# Altium integrated library Samtec 2 mm Pitch Terminal Strips.IntLib: 623 symbols (part 4 of 5) (continued)
## TW-05-07-T-D-500-SM (continued)
SMT Board Stacker, Vertical, -55 to 105 degC, 2 mm Pitch, 10-Pin, Male, RoHS; Manufacturer: Samtec; PartNumber: TW-05-07-T-D-500-SM; Pitch: 2 mm; DatasheetVersion: F-214; PackageVersion: CL, 3/1993; PackageReference: TW-05-07-X-D-500-SM; PackageDescription: High Temp 2mm SMT Board Stacking Terminal Strip ASM; Orientation: Vertical; RoHS: True; Temperature Range: -55 to 105 degC; Mounting Technology: Surface Mount; ComponentLink1Description: Manufacturer URL; ComponentLink1URL: http://www.samtec.com; ComponentLink2Description: Datasheet; ComponentLink2URL: http://d2a072wq521u33.cloudfront.net/catalog_english//TW_SM.PDF; ComponentLink3Description: Package Specification; ComponentLink3URL: http://www.samtec.com/documents/webfiles/cpdf/TW-XX-XX-XXX-X-XXX-SM-XXX-XX-MKT1.pdf
footprint SMTC-TW-05-07-X-D-500-SM (SMT Board Stacking Terminal Strip ASM, 2x5 Pins, Vertical, 2mm Pitch, Male)
pins: 1, 2, 3, 4, 5, 6, 7, 8, 9, 10

## TW-05-07-T-D-500-SM-A
designator P?
SMT Board Stacker, Vertical, -55 to 105 degC, 2 mm Pitch, 10-Pin, Male, RoHS; Manufacturer: Samtec; PartNumber: TW-05-07-T-D-500-SM-A; Pitch: 2 mm; DatasheetVersion: F-214; PackageVersion: CL, 3/1993; PackageReference: TW-05-07-X-D-500-SM-A; PackageDescription: High Temp 2mm SMT Board Stacking Terminal Strip ASM; Orientation: Vertical; RoHS: True; Temperature Range: -55 to 105 degC; Mounting Technology: Surface Mount; ComponentLink1Description: Manufacturer URL; ComponentLink1URL: http://www.samtec.com; ComponentLink2Description: Datasheet; ComponentLink2URL: http://d2a072wq521u33.cloudfront.net/catalog_english//TW_SM.PDF; ComponentLink3Description: Package Specification; ComponentLink3URL: http://www.samtec.com/documents/webfiles/cpdf/TW-XX-XX-XXX-X-XXX-SM-XXX-XX-MKT1.pdf
footprint SMTC-TW-05-07-X-D-500-SM-A (SMT Board Stacking Terminal Strip ASM, 2x5 Pins, Vertical, 2mm Pitch, Male)
pins: 1, 2, 3, 4, 5, 6, 7, 8, 9, 10

## TW-05-07-T-D-560-SM
designator P?
SMT Board Stacker, Vertical, -55 to 105 degC, 2 mm Pitch, 10-Pin, Male, RoHS; Manufacturer: Samtec; PartNumber: TW-05-07-T-D-560-SM; Pitch: 2 mm; DatasheetVersion: F-214; PackageVersion: CL, 3/1993; PackageReference: TW-05-07-X-D-560-SM; PackageDescription: High Temp 2mm SMT Board Stacking Terminal Strip ASM; Orientation: Vertical; RoHS: True; Temperature Range: -55 to 105 degC; Mounting Technology: Surface Mount; ComponentLink1Description: Manufacturer URL; ComponentLink1URL: http://www.samtec.com; ComponentLink2Description: Datasheet; ComponentLink2URL: http://d2a072wq521u33.cloudfront.net/catalog_english//TW_SM.PDF; ComponentLink3Description: Package Specification; ComponentLink3URL: http://www.samtec.com/documents/webfiles/cpdf/TW-XX-XX-XXX-X-XXX-SM-XXX-XX-MKT1.pdf
footprint SMTC-TW-05-07-X-D-560-SM (SMT Board Stacking Terminal Strip ASM, 2x5 Pins, Vertical, 2mm Pitch, Male)
pins: 1, 2, 3, 4, 5, 6, 7, 8, 9, 10

## TW-05-09-F-S-260-100
designator P?
Through-Hole Board Stacker, Vertical, -55 to 125 degC, 2 mm Pitch, 5-Pin, Male, RoHS; Manufacturer: Samtec; PartNumber: TW-05-09-F-S-260-100; Pitch: 2 mm; DatasheetVersion: F-214; PackageVersion: BF, 6/1998; PackageReference: TW-05-09-X-S-260-100; PackageDescription: High Temp 2mm Terminal Strip(Board Stacking); Orientation: Vertical; RoHS: True; Temperature Range: -55 to 125 degC; Mounting Technology: Through-hole; ComponentLink1Description: Manufacturer URL; ComponentLink1URL: http://www.samtec.com; ComponentLink2Description: Datasheet; ComponentLink2URL: http://d2a072wq521u33.cloudfront.net/catalog_english//TW_TH.PDF; ComponentLink3Description: Package Specification; ComponentLink3URL: http://www.samtec.com/documents/webfiles/cpdf/TW-XX-XX-X-X-XXX-XXX-XXX-XX-MKT2.pdf
footprint SMTC-TW-05-09-X-S-260-100 (Terminal Strip, 1x5 Pins, Vertical, 2mm Pitch, Male)
pins: 1, 2, 3, 4, 5

## TW-05-09-L-S-260-100
designator P?
Through-Hole Board Stacker, Vertical, -55 to 125 degC, 2 mm Pitch, 5-Pin, Male, RoHS; Manufacturer: Samtec; PartNumber: TW-05-09-L-S-260-100; Pitch: 2 mm; DatasheetVersion: F-214; PackageVersion: BF, 6/1998; PackageReference: TW-05-09-X-S-260-100; PackageDescription: High Temp 2mm Terminal Strip(Board Stacking); Orientation: Vertical; RoHS: True; Temperature Range: -55 to 125 degC; Mounting Technology: Through-hole; ComponentLink1Description: Manufacturer URL; ComponentLink1URL: http://www.samtec.com; ComponentLink2Description: Datasheet; ComponentLink2URL: http://d2a072wq521u33.cloudfront.net/catalog_english//TW_TH.PDF; ComponentLink3Description: Package Specification; ComponentLink3URL: http://www.samtec.com/documents/webfiles/cpdf/TW-XX-XX-X-X-XXX-XXX-XXX-XX-MKT2.pdf
footprint SMTC-TW-05-09-X-S-260-100 (Terminal Strip, 1x5 Pins, Vertical, 2mm Pitch, Male)
pins: 1, 2, 3, 4, 5

## TW-05-09-T-S-260-100
designator P?
Through-Hole Board Stacker, Vertical, -55 to 105 degC, 2 mm Pitch, 5-Pin, Male, RoHS; Manufacturer: Samtec; PartNumber: TW-05-09-T-S-260-100; Pitch: 2 mm; DatasheetVersion: F-214; PackageVersion: BF, 6/1998; PackageReference: TW-05-09-X-S-260-100; PackageDescription: High Temp 2mm Terminal Strip(Board Stacking); Orientation: Vertical; RoHS: True; Temperature Range: -55 to 105 degC; Mounting Technology: Through-hole; ComponentLink1Description: Manufacturer URL; ComponentLink1URL: http://www.samtec.com; ComponentLink2Description: Datasheet; ComponentLink2URL: http://d2a072wq521u33.cloudfront.net/catalog_english//TW_TH.PDF; ComponentLink3Description: Package Specification; ComponentLink3URL: http://www.samtec.com/documents/webfiles/cpdf/TW-XX-XX-X-X-XXX-XXX-XXX-XX-MKT2.pdf
footprint SMTC-TW-05-09-X-S-260-100 (Terminal Strip, 1x5 Pins, Vertical, 2mm Pitch, Male)
pins: 1, 2, 3, 4, 5

## TW-06-01-F-D-135-075
designator P?
Through-Hole Board Stacker, Vertical, -55 to 125 degC, 2 mm Pitch, 12-Pin, Male, RoHS; Manufacturer: Samtec; PartNumber: TW-06-01-F-D-135-075; Pitch: 2 mm; DatasheetVersion: F-214; PackageVersion: BF, 6/1998; PackageReference: TW-06-01-X-D-135-075; PackageDescription: High Temp 2mm Terminal Strip(Board Stacking); Orientation: Vertical; RoHS: True; Temperature Range: -55 to 125 degC; Mounting Technology: Through-hole; ComponentLink1Description: Manufacturer URL; ComponentLink1URL: http://www.samtec.com; ComponentLink2Description: Datasheet; ComponentLink2URL: http://d2a072wq521u33.cloudfront.net/catalog_english//TW_TH.PDF; ComponentLink3Description: Package Specification; ComponentLink3URL: http://www.samtec.com/documents/webfiles/cpdf/TW-XX-XX-X-X-XXX-XXX-XXX-XX-MKT2.pdf
footprint SMTC-TW-06-01-X-D-135-075 (Terminal Strip, 2x6 Pins, Vertical, 2mm Pitch, Male)
pins: 1, 2, 3, 4, 5, 6, 7, 8, 9, 10, 11, 12

## TW-06-01-L-D-135-075
designator P?
Through-Hole Board Stacker, Vertical, -55 to 125 degC, 2 mm Pitch, 12-Pin, Male, RoHS; Manufacturer: Samtec; PartNumber: TW-06-01-L-D-135-075; Pitch: 2 mm; DatasheetVersion: F-214; PackageVersion: BF, 6/1998; PackageReference: TW-06-01-X-D-135-075; PackageDescription: High Temp 2mm Terminal Strip(Board Stacking); Orientation: Vertical; RoHS: True; Temperature Range: -55 to 125 degC; Mounting Technology: Through-hole; ComponentLink1Description: Manufacturer URL; ComponentLink1URL: http://www.samtec.com; ComponentLink2Description: Datasheet; ComponentLink2URL: http://d2a072wq521u33.cloudfront.net/catalog_english//TW_TH.PDF; ComponentLink3Description: Package Specification; ComponentLink3URL: http://www.samtec.com/documents/webfiles/cpdf/TW-XX-XX-X-X-XXX-XXX-XXX-XX-MKT2.pdf
footprint SMTC-TW-06-01-X-D-135-075 (Terminal Strip, 2x6 Pins, Vertical, 2mm Pitch, Male)
pins: 1, 2, 3, 4, 5, 6, 7, 8, 9, 10, 11, 12

## TW-06-01-T-D-135-075
designator P?
Through-Hole Board Stacker, Vertical, -55 to 105 degC, 2 mm Pitch, 12-Pin, Male, RoHS; Manufacturer: Samtec; PartNumber: TW-06-01-T-D-135-075; Pitch: 2 mm; DatasheetVersion: F-214; PackageVersion: BF, 6/1998; PackageReference: TW-06-01-X-D-135-075; PackageDescription: High Temp 2mm Terminal Strip(Board Stacking); Orientation: Vertical; RoHS: True; Temperature Range: -55 to 105 degC; Mounting Technology: Through-hole; ComponentLink1Description: Manufacturer URL; ComponentLink1URL: http://www.samtec.com; ComponentLink2Description: Datasheet; ComponentLink2URL: http://d2a072wq521u33.cloudfront.net/catalog_english//TW_TH.PDF; ComponentLink3Description: Package Specification; ComponentLink3URL: http://www.samtec.com/documents/webfiles/cpdf/TW-XX-XX-X-X-XXX-XXX-XXX-XX-MKT2.pdf
footprint SMTC-TW-06-01-X-D-135-075 (Terminal Strip, 2x6 Pins, Vertical, 2mm Pitch, Male)
pins: 1, 2, 3, 4, 5, 6, 7, 8, 9, 10, 11, 12

## TW-06-06-F-D-280-145
designator P?
Through-Hole Board Stacker, Vertical, -55 to 125 degC, 2 mm Pitch, 12-Pin, Male, RoHS; Manufacturer: Samtec; PartNumber: TW-06-06-F-D-280-145; Pitch: 2 mm; DatasheetVersion: F-214; PackageVersion: BF, 6/1998; PackageReference: TW-06-06-X-D-280-145; PackageDescription: High Temp 2mm Terminal Strip(Board Stacking); Orientation: Vertical; RoHS: True; Temperature Range: -55 to 125 degC; Mounting Technology: Through-hole; ComponentLink1Description: Manufacturer URL; ComponentLink1URL: http://www.samtec.com; ComponentLink2Description: Datasheet; ComponentLink2URL: http://d2a072wq521u33.cloudfront.net/catalog_english//TW_TH.PDF; ComponentLink3Description: Package Specification; ComponentLink3URL: http://www.samtec.com/documents/webfiles/cpdf/TW-XX-XX-X-X-XXX-XXX-XXX-XX-MKT2.pdf
footprint SMTC-TW-06-06-X-D-280-145 (Terminal Strip, 2x6 Pins, Vertical, 2mm Pitch, Male)
pins: 1, 2, 3, 4, 5, 6, 7, 8, 9, 10, 11, 12

## TW-06-06-F-D-280-149
designator P?
Through-Hole Board Stacker, Vertical, -55 to 125 degC, 2 mm Pitch, 12-Pin, Male, RoHS; Manufacturer: Samtec; PartNumber: TW-06-06-F-D-280-149; Pitch: 2 mm; DatasheetVersion: F-214; PackageVersion: BF, 6/1998; PackageReference: TW-06-06-X-D-280-149; PackageDescription: High Temp 2mm Terminal Strip(Board Stacking); Orientation: Vertical; RoHS: True; Temperature Range: -55 to 125 degC; Mounting Technology: Through-hole; ComponentLink1Description: Manufacturer URL; ComponentLink1URL: http://www.samtec.com; ComponentLink2Description: Datasheet; ComponentLink2URL: http://d2a072wq521u33.cloudfront.net/catalog_english//TW_TH.PDF; ComponentLink3Description: Package Specification; ComponentLink3URL: http://www.samtec.com/documents/webfiles/cpdf/TW-XX-XX-X-X-XXX-XXX-XXX-XX-MKT2.pdf
footprint SMTC-TW-06-06-X-D-280-149 (Terminal Strip, 2x6 Pins, Vertical, 2mm Pitch, Male)
pins: 1, 2, 3, 4, 5, 6, 7, 8, 9, 10, 11, 12

## TW-06-06-L-D-280-145
designator P?
Through-Hole Board Stacker, Vertical, -55 to 125 degC, 2 mm Pitch, 12-Pin, Male, RoHS; Manufacturer: Samtec; PartNumber: TW-06-06-L-D-280-145; Pitch: 2 mm; DatasheetVersion: F-214; PackageVersion: BF, 6/1998; PackageReference: TW-06-06-X-D-280-145; PackageDescription: High Temp 2mm Terminal Strip(Board Stacking); Orientation: Vertical; RoHS: True; Temperature Range: -55 to 125 degC; Mounting Technology: Through-hole; ComponentLink1Description: Manufacturer URL; ComponentLink1URL: http://www.samtec.com; ComponentLink2Description: Datasheet; ComponentLink2URL: http://d2a072wq521u33.cloudfront.net/catalog_english//TW_TH.PDF; ComponentLink3Description: Package Specification; ComponentLink3URL: http://www.samtec.com/documents/webfiles/cpdf/TW-XX-XX-X-X-XXX-XXX-XXX-XX-MKT2.pdf
footprint SMTC-TW-06-06-X-D-280-145 (Terminal Strip, 2x6 Pins, Vertical, 2mm Pitch, Male)
pins: 1, 2, 3, 4, 5, 6, 7, 8, 9, 10, 11, 12

## TW-06-06-L-D-280-149
designator P?
Through-Hole Board Stacker, Vertical, -55 to 125 degC, 2 mm Pitch, 12-Pin, Male, RoHS; Manufacturer: Samtec; PartNumber: TW-06-06-L-D-280-149; Pitch: 2 mm; DatasheetVersion: F-214; PackageVersion: BF, 6/1998; PackageReference: TW-06-06-X-D-280-149; PackageDescription: High Temp 2mm Terminal Strip(Board Stacking); Orientation: Vertical; RoHS: True; Temperature Range: -55 to 125 degC; Mounting Technology: Through-hole; ComponentLink1Description: Manufacturer URL; ComponentLink1URL: http://www.samtec.com; ComponentLink2Description: Datasheet; ComponentLink2URL: http://d2a072wq521u33.cloudfront.net/catalog_english//TW_TH.PDF; ComponentLink3Description: Package Specification; ComponentLink3URL: http://www.samtec.com/documents/webfiles/cpdf/TW-XX-XX-X-X-XXX-XXX-XXX-XX-MKT2.pdf
footprint SMTC-TW-06-06-X-D-280-149 (Terminal Strip, 2x6 Pins, Vertical, 2mm Pitch, Male)
pins: 1, 2, 3, 4, 5, 6, 7, 8, 9, 10, 11, 12

## TW-06-06-T-D-280-145
designator P?
Through-Hole Board Stacker, Vertical, -55 to 105 degC, 2 mm Pitch, 12-Pin, Male, RoHS; Manufacturer: Samtec; PartNumber: TW-06-06-T-D-280-145; Pitch: 2 mm; DatasheetVersion: F-214; PackageVersion: BF, 6/1998; PackageReference: TW-06-06-X-D-280-145; PackageDescription: High Temp 2mm Terminal Strip(Board Stacking); Orientation: Vertical; RoHS: True; Temperature Range: -55 to 105 degC; Mounting Technology: Through-hole; ComponentLink1Description: Manufacturer URL; ComponentLink1URL: http://www.samtec.com; ComponentLink2Description: Datasheet; ComponentLink2URL: http://d2a072wq521u33.cloudfront.net/catalog_english//TW_TH.PDF; ComponentLink3Description: Package Specification; ComponentLink3URL: http://www.samtec.com/documents/webfiles/cpdf/TW-XX-XX-X-X-XXX-XXX-XXX-XX-MKT2.pdf
footprint SMTC-TW-06-06-X-D-280-145 (Terminal Strip, 2x6 Pins, Vertical, 2mm Pitch, Male)
pins: 1, 2, 3, 4, 5, 6, 7, 8, 9, 10, 11, 12

## TW-06-06-T-D-280-149
designator P?
Through-Hole Board Stacker, Vertical, -55 to 105 degC, 2 mm Pitch, 12-Pin, Male, RoHS; Manufacturer: Samtec; PartNumber: TW-06-06-T-D-280-149; Pitch: 2 mm; DatasheetVersion: F-214; PackageVersion: BF, 6/1998; PackageReference: TW-06-06-X-D-280-149; PackageDescription: High Temp 2mm Terminal Strip(Board Stacking); Orientation: Vertical; RoHS: True; Temperature Range: -55 to 105 degC; Mounting Technology: Through-hole; ComponentLink1Description: Manufacturer URL; ComponentLink1URL: http://www.samtec.com; ComponentLink2Description: Datasheet; ComponentLink2URL: http://d2a072wq521u33.cloudfront.net/catalog_english//TW_TH.PDF; ComponentLink3Description: Package Specification; ComponentLink3URL: http://www.samtec.com/documents/webfiles/cpdf/TW-XX-XX-X-X-XXX-XXX-XXX-XX-MKT2.pdf
footprint SMTC-TW-06-06-X-D-280-149 (Terminal Strip, 2x6 Pins, Vertical, 2mm Pitch, Male)
pins: 1, 2, 3, 4, 5, 6, 7, 8, 9, 10, 11, 12

## TW-06-09-F-Q-145-160
designator P?
Through-Hole Board Stacker, Vertical, -55 to 125 degC, 2 mm Pitch, 24-Pin, Male, RoHS; Manufacturer: Samtec; PartNumber: TW-06-09-F-Q-145-160; Pitch: 2 mm; DatasheetVersion: F-214; PackageVersion: BF, 6/1998; PackageReference: TW-06-09-X-Q-145-160; PackageDescription: High Temp 2mm Terminal Strip(Board Stacking); Orientation: Vertical; RoHS: True; Temperature Range: -55 to 125 degC; Mounting Technology: Through-hole; ComponentLink1Description: Manufacturer URL; ComponentLink1URL: http://www.samtec.com; ComponentLink2Description: Datasheet; ComponentLink2URL: http://d2a072wq521u33.cloudfront.net/catalog_english//TW_TH.PDF; ComponentLink3Description: Package Specification; ComponentLink3URL: http://www.samtec.com/documents/webfiles/cpdf/TW-XX-XX-X-X-XXX-XXX-XXX-XX-MKT2.pdf
footprint SMTC-TW-06-09-X-Q-145-160 (Terminal Strip, 4x6 Pins, Vertical, 2mm Pitch, Male)
pins: 1, 2, 3, 4, 5, 6, 7, 8, 9, 10, 11, 12, 13, 14, 15, 16, 17, 18, 19, 20, 21, 22, 23, 24

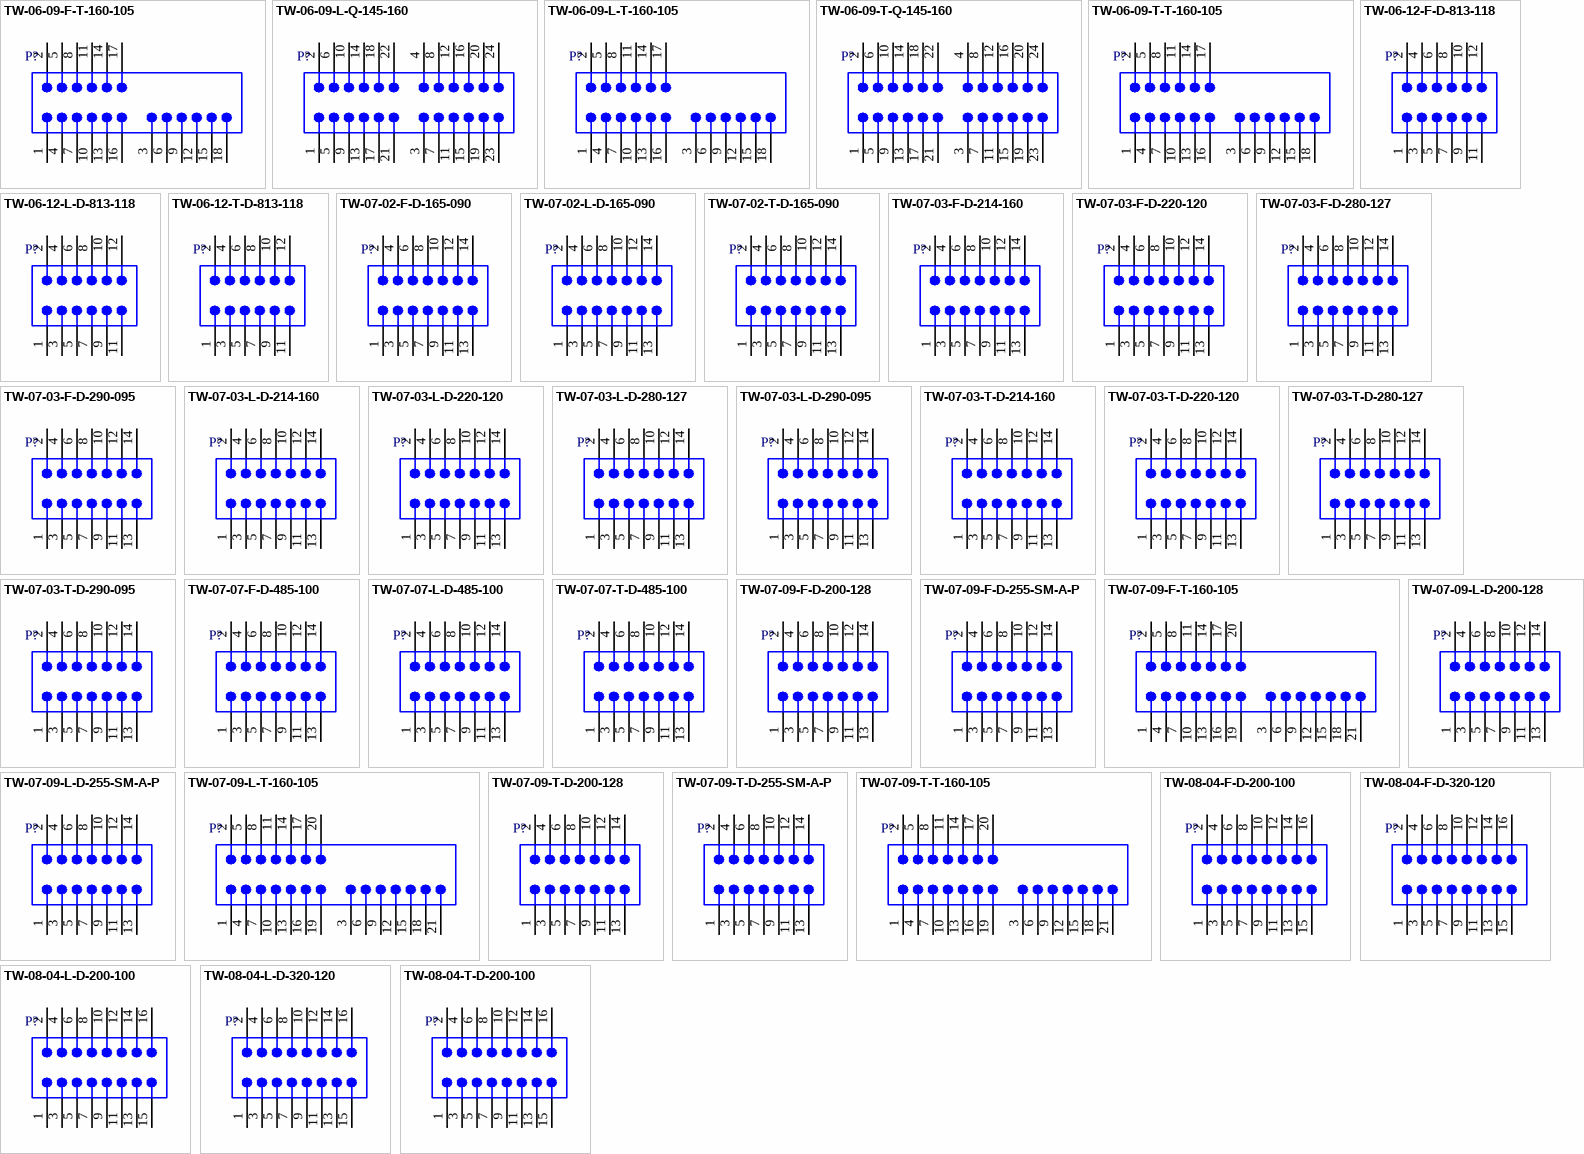
[diagram p12: symbols TW-06-09-F-T-160-105 to TW-08-04-T-D-200-100]

## TW-06-09-F-T-160-105
designator P?
Through-Hole Board Stacker, Vertical, -55 to 125 degC, 2 mm Pitch, 18-Pin, Male, RoHS; Manufacturer: Samtec; PartNumber: TW-06-09-F-T-160-105; Pitch: 2 mm; DatasheetVersion: F-214; PackageVersion: BF, 6/1998; PackageReference: TW-06-09-X-T-160-105; PackageDescription: High Temp 2mm Terminal Strip(Board Stacking); Orientation: Vertical; RoHS: True; Temperature Range: -55 to 125 degC; Mounting Technology: Through-hole; ComponentLink1Description: Manufacturer URL; ComponentLink1URL: http://www.samtec.com; ComponentLink2Description: Datasheet; ComponentLink2URL: http://d2a072wq521u33.cloudfront.net/catalog_english//TW_TH.PDF; ComponentLink3Description: Package Specification; ComponentLink3URL: http://www.samtec.com/documents/webfiles/cpdf/TW-XX-XX-X-X-XXX-XXX-XXX-XX-MKT2.pdf
footprint SMTC-TW-06-09-X-T-160-105 (Terminal Strip, 3x6 Pins, Vertical, 2mm Pitch, Male)
pins: 1, 2, 3, 4, 5, 6, 7, 8, 9, 10, 11, 12, 13, 14, 15, 16, 17, 18

## TW-06-09-L-Q-145-160
designator P?
Through-Hole Board Stacker, Vertical, -55 to 125 degC, 2 mm Pitch, 24-Pin, Male, RoHS; Manufacturer: Samtec; PartNumber: TW-06-09-L-Q-145-160; Pitch: 2 mm; DatasheetVersion: F-214; PackageVersion: BF, 6/1998; PackageReference: TW-06-09-X-Q-145-160; PackageDescription: High Temp 2mm Terminal Strip(Board Stacking); Orientation: Vertical; RoHS: True; Temperature Range: -55 to 125 degC; Mounting Technology: Through-hole; ComponentLink1Description: Manufacturer URL; ComponentLink1URL: http://www.samtec.com; ComponentLink2Description: Datasheet; ComponentLink2URL: http://d2a072wq521u33.cloudfront.net/catalog_english//TW_TH.PDF; ComponentLink3Description: Package Specification; ComponentLink3URL: http://www.samtec.com/documents/webfiles/cpdf/TW-XX-XX-X-X-XXX-XXX-XXX-XX-MKT2.pdf
footprint SMTC-TW-06-09-X-Q-145-160 (Terminal Strip, 4x6 Pins, Vertical, 2mm Pitch, Male)
pins: 1, 2, 3, 4, 5, 6, 7, 8, 9, 10, 11, 12, 13, 14, 15, 16, 17, 18, 19, 20, 21, 22, 23, 24

## TW-06-09-L-T-160-105
designator P?
Through-Hole Board Stacker, Vertical, -55 to 125 degC, 2 mm Pitch, 18-Pin, Male, RoHS; Manufacturer: Samtec; PartNumber: TW-06-09-L-T-160-105; Pitch: 2 mm; DatasheetVersion: F-214; PackageVersion: BF, 6/1998; PackageReference: TW-06-09-X-T-160-105; PackageDescription: High Temp 2mm Terminal Strip(Board Stacking); Orientation: Vertical; RoHS: True; Temperature Range: -55 to 125 degC; Mounting Technology: Through-hole; ComponentLink1Description: Manufacturer URL; ComponentLink1URL: http://www.samtec.com; ComponentLink2Description: Datasheet; ComponentLink2URL: http://d2a072wq521u33.cloudfront.net/catalog_english//TW_TH.PDF; ComponentLink3Description: Package Specification; ComponentLink3URL: http://www.samtec.com/documents/webfiles/cpdf/TW-XX-XX-X-X-XXX-XXX-XXX-XX-MKT2.pdf
footprint SMTC-TW-06-09-X-T-160-105 (Terminal Strip, 3x6 Pins, Vertical, 2mm Pitch, Male)
pins: 1, 2, 3, 4, 5, 6, 7, 8, 9, 10, 11, 12, 13, 14, 15, 16, 17, 18

## TW-06-09-T-Q-145-160
designator P?
Through-Hole Board Stacker, Vertical, -55 to 105 degC, 2 mm Pitch, 24-Pin, Male, RoHS; Manufacturer: Samtec; PartNumber: TW-06-09-T-Q-145-160; Pitch: 2 mm; DatasheetVersion: F-214; PackageVersion: BF, 6/1998; PackageReference: TW-06-09-X-Q-145-160; PackageDescription: High Temp 2mm Terminal Strip(Board Stacking); Orientation: Vertical; RoHS: True; Temperature Range: -55 to 105 degC; Mounting Technology: Through-hole; ComponentLink1Description: Manufacturer URL; ComponentLink1URL: http://www.samtec.com; ComponentLink2Description: Datasheet; ComponentLink2URL: http://d2a072wq521u33.cloudfront.net/catalog_english//TW_TH.PDF; ComponentLink3Description: Package Specification; ComponentLink3URL: http://www.samtec.com/documents/webfiles/cpdf/TW-XX-XX-X-X-XXX-XXX-XXX-XX-MKT2.pdf
footprint SMTC-TW-06-09-X-Q-145-160 (Terminal Strip, 4x6 Pins, Vertical, 2mm Pitch, Male)
pins: 1, 2, 3, 4, 5, 6, 7, 8, 9, 10, 11, 12, 13, 14, 15, 16, 17, 18, 19, 20, 21, 22, 23, 24

## TW-06-09-T-T-160-105
designator P?
Through-Hole Board Stacker, Vertical, -55 to 105 degC, 2 mm Pitch, 18-Pin, Male, RoHS; Manufacturer: Samtec; PartNumber: TW-06-09-T-T-160-105; Pitch: 2 mm; DatasheetVersion: F-214; PackageVersion: BF, 6/1998; PackageReference: TW-06-09-X-T-160-105; PackageDescription: High Temp 2mm Terminal Strip(Board Stacking); Orientation: Vertical; RoHS: True; Temperature Range: -55 to 105 degC; Mounting Technology: Through-hole; ComponentLink1Description: Manufacturer URL; ComponentLink1URL: http://www.samtec.com; ComponentLink2Description: Datasheet; ComponentLink2URL: http://d2a072wq521u33.cloudfront.net/catalog_english//TW_TH.PDF; ComponentLink3Description: Package Specification; ComponentLink3URL: http://www.samtec.com/documents/webfiles/cpdf/TW-XX-XX-X-X-XXX-XXX-XXX-XX-MKT2.pdf
footprint SMTC-TW-06-09-X-T-160-105 (Terminal Strip, 3x6 Pins, Vertical, 2mm Pitch, Male)
pins: 1, 2, 3, 4, 5, 6, 7, 8, 9, 10, 11, 12, 13, 14, 15, 16, 17, 18

## TW-06-12-F-D-813-118
designator P?
Through-Hole Board Stacker, Vertical, -55 to 125 degC, 2 mm Pitch, 12-Pin, Male, RoHS; Manufacturer: Samtec; PartNumber: TW-06-12-F-D-813-118; Pitch: 2 mm; DatasheetVersion: F-214; PackageVersion: BF, 6/1998; PackageReference: TW-06-12-X-D-813-118; PackageDescription: High Temp 2mm Terminal Strip(Board Stacking); Orientation: Vertical; RoHS: True; Temperature Range: -55 to 125 degC; Mounting Technology: Through-hole; ComponentLink1Description: Manufacturer URL; ComponentLink1URL: http://www.samtec.com; ComponentLink2Description: Datasheet; ComponentLink2URL: http://d2a072wq521u33.cloudfront.net/catalog_english//TW_TH.PDF; ComponentLink3Description: Package Specification; ComponentLink3URL: http://www.samtec.com/documents/webfiles/cpdf/TW-XX-XX-X-X-XXX-XXX-XXX-XX-MKT2.pdf
footprint SMTC-TW-06-12-X-D-813-118 (Terminal Strip, 2x6 Pins, Vertical, 2mm Pitch, Male)
pins: 1, 2, 3, 4, 5, 6, 7, 8, 9, 10, 11, 12

## TW-06-12-L-D-813-118
designator P?
Through-Hole Board Stacker, Vertical, -55 to 125 degC, 2 mm Pitch, 12-Pin, Male, RoHS; Manufacturer: Samtec; PartNumber: TW-06-12-L-D-813-118; Pitch: 2 mm; DatasheetVersion: F-214; PackageVersion: BF, 6/1998; PackageReference: TW-06-12-X-D-813-118; PackageDescription: High Temp 2mm Terminal Strip(Board Stacking); Orientation: Vertical; RoHS: True; Temperature Range: -55 to 125 degC; Mounting Technology: Through-hole; ComponentLink1Description: Manufacturer URL; ComponentLink1URL: http://www.samtec.com; ComponentLink2Description: Datasheet; ComponentLink2URL: http://d2a072wq521u33.cloudfront.net/catalog_english//TW_TH.PDF; ComponentLink3Description: Package Specification; ComponentLink3URL: http://www.samtec.com/documents/webfiles/cpdf/TW-XX-XX-X-X-XXX-XXX-XXX-XX-MKT2.pdf
footprint SMTC-TW-06-12-X-D-813-118 (Terminal Strip, 2x6 Pins, Vertical, 2mm Pitch, Male)
pins: 1, 2, 3, 4, 5, 6, 7, 8, 9, 10, 11, 12

## TW-06-12-T-D-813-118
designator P?
Through-Hole Board Stacker, Vertical, -55 to 105 degC, 2 mm Pitch, 12-Pin, Male, RoHS; Manufacturer: Samtec; PartNumber: TW-06-12-T-D-813-118; Pitch: 2 mm; DatasheetVersion: F-214; PackageVersion: BF, 6/1998; PackageReference: TW-06-12-X-D-813-118; PackageDescription: High Temp 2mm Terminal Strip(Board Stacking); Orientation: Vertical; RoHS: True; Temperature Range: -55 to 105 degC; Mounting Technology: Through-hole; ComponentLink1Description: Manufacturer URL; ComponentLink1URL: http://www.samtec.com; ComponentLink2Description: Datasheet; ComponentLink2URL: http://d2a072wq521u33.cloudfront.net/catalog_english//TW_TH.PDF; ComponentLink3Description: Package Specification; ComponentLink3URL: http://www.samtec.com/documents/webfiles/cpdf/TW-XX-XX-X-X-XXX-XXX-XXX-XX-MKT2.pdf
footprint SMTC-TW-06-12-X-D-813-118 (Terminal Strip, 2x6 Pins, Vertical, 2mm Pitch, Male)
pins: 1, 2, 3, 4, 5, 6, 7, 8, 9, 10, 11, 12

## TW-07-02-F-D-165-090
designator P?
Through-Hole Board Stacker, Vertical, -55 to 125 degC, 2 mm Pitch, 14-Pin, Male, RoHS; Manufacturer: Samtec; PartNumber: TW-07-02-F-D-165-090; Pitch: 2 mm; DatasheetVersion: F-214; PackageVersion: BF, 6/1998; PackageReference: TW-07-02-X-D-165-090; PackageDescription: High Temp 2mm Terminal Strip(Board Stacking); Orientation: Vertical; RoHS: True; Temperature Range: -55 to 125 degC; Mounting Technology: Through-hole; ComponentLink1Description: Manufacturer URL; ComponentLink1URL: http://www.samtec.com; ComponentLink2Description: Datasheet; ComponentLink2URL: http://d2a072wq521u33.cloudfront.net/catalog_english//TW_TH.PDF; ComponentLink3Description: Package Specification; ComponentLink3URL: http://www.samtec.com/documents/webfiles/cpdf/TW-XX-XX-X-X-XXX-XXX-XXX-XX-MKT2.pdf
footprint SMTC-TW-07-02-X-D-165-090 (Terminal Strip, 2x7 Pins, Vertical, 2mm Pitch, Male)
pins: 1, 2, 3, 4, 5, 6, 7, 8, 9, 10, 11, 12, 13, 14

## TW-07-02-L-D-165-090
designator P?
Through-Hole Board Stacker, Vertical, -55 to 125 degC, 2 mm Pitch, 14-Pin, Male, RoHS; Manufacturer: Samtec; PartNumber: TW-07-02-L-D-165-090; Pitch: 2 mm; DatasheetVersion: F-214; PackageVersion: BF, 6/1998; PackageReference: TW-07-02-X-D-165-090; PackageDescription: High Temp 2mm Terminal Strip(Board Stacking); Orientation: Vertical; RoHS: True; Temperature Range: -55 to 125 degC; Mounting Technology: Through-hole; ComponentLink1Description: Manufacturer URL; ComponentLink1URL: http://www.samtec.com; ComponentLink2Description: Datasheet; ComponentLink2URL: http://d2a072wq521u33.cloudfront.net/catalog_english//TW_TH.PDF; ComponentLink3Description: Package Specification; ComponentLink3URL: http://www.samtec.com/documents/webfiles/cpdf/TW-XX-XX-X-X-XXX-XXX-XXX-XX-MKT2.pdf
footprint SMTC-TW-07-02-X-D-165-090 (Terminal Strip, 2x7 Pins, Vertical, 2mm Pitch, Male)
pins: 1, 2, 3, 4, 5, 6, 7, 8, 9, 10, 11, 12, 13, 14

## TW-07-02-T-D-165-090
designator P?
Through-Hole Board Stacker, Vertical, -55 to 105 degC, 2 mm Pitch, 14-Pin, Male, RoHS; Manufacturer: Samtec; PartNumber: TW-07-02-T-D-165-090; Pitch: 2 mm; DatasheetVersion: F-214; PackageVersion: BF, 6/1998; PackageReference: TW-07-02-X-D-165-090; PackageDescription: High Temp 2mm Terminal Strip(Board Stacking); Orientation: Vertical; RoHS: True; Temperature Range: -55 to 105 degC; Mounting Technology: Through-hole; ComponentLink1Description: Manufacturer URL; ComponentLink1URL: http://www.samtec.com; ComponentLink2Description: Datasheet; ComponentLink2URL: http://d2a072wq521u33.cloudfront.net/catalog_english//TW_TH.PDF; ComponentLink3Description: Package Specification; ComponentLink3URL: http://www.samtec.com/documents/webfiles/cpdf/TW-XX-XX-X-X-XXX-XXX-XXX-XX-MKT2.pdf
footprint SMTC-TW-07-02-X-D-165-090 (Terminal Strip, 2x7 Pins, Vertical, 2mm Pitch, Male)
pins: 1, 2, 3, 4, 5, 6, 7, 8, 9, 10, 11, 12, 13, 14

## TW-07-03-F-D-214-160
designator P?
Through-Hole Board Stacker, Vertical, -55 to 125 degC, 2 mm Pitch, 14-Pin, Male, RoHS; Manufacturer: Samtec; PartNumber: TW-07-03-F-D-214-160; Pitch: 2 mm; DatasheetVersion: F-214; PackageVersion: BF, 6/1998; PackageReference: TW-07-03-X-D-214-160; PackageDescription: High Temp 2mm Terminal Strip(Board Stacking); Orientation: Vertical; RoHS: True; Temperature Range: -55 to 125 degC; Mounting Technology: Through-hole; ComponentLink1Description: Manufacturer URL; ComponentLink1URL: http://www.samtec.com; ComponentLink2Description: Datasheet; ComponentLink2URL: http://d2a072wq521u33.cloudfront.net/catalog_english//TW_TH.PDF; ComponentLink3Description: Package Specification; ComponentLink3URL: http://www.samtec.com/documents/webfiles/cpdf/TW-XX-XX-X-X-XXX-XXX-XXX-XX-MKT2.pdf
footprint SMTC-TW-07-03-X-D-214-160 (Terminal Strip, 2x7 Pins, Vertical, 2mm Pitch, Male)
pins: 1, 2, 3, 4, 5, 6, 7, 8, 9, 10, 11, 12, 13, 14

## TW-07-03-F-D-220-120
designator P?
Through-Hole Board Stacker, Vertical, -55 to 125 degC, 2 mm Pitch, 14-Pin, Male, RoHS; Manufacturer: Samtec; PartNumber: TW-07-03-F-D-220-120; Pitch: 2 mm; DatasheetVersion: F-214; PackageVersion: BF, 6/1998; PackageReference: TW-07-03-X-D-220-120; PackageDescription: High Temp 2mm Terminal Strip(Board Stacking); Orientation: Vertical; RoHS: True; Temperature Range: -55 to 125 degC; Mounting Technology: Through-hole; ComponentLink1Description: Manufacturer URL; ComponentLink1URL: http://www.samtec.com; ComponentLink2Description: Datasheet; ComponentLink2URL: http://d2a072wq521u33.cloudfront.net/catalog_english//TW_TH.PDF; ComponentLink3Description: Package Specification; ComponentLink3URL: http://www.samtec.com/documents/webfiles/cpdf/TW-XX-XX-X-X-XXX-XXX-XXX-XX-MKT2.pdf
footprint SMTC-TW-07-03-X-D-220-120 (Terminal Strip, 2x7 Pins, Vertical, 2mm Pitch, Male)
pins: 1, 2, 3, 4, 5, 6, 7, 8, 9, 10, 11, 12, 13, 14

## TW-07-03-F-D-280-127
designator P?
Through-Hole Board Stacker, Vertical, -55 to 125 degC, 2 mm Pitch, 14-Pin, Male, RoHS; Manufacturer: Samtec; PartNumber: TW-07-03-F-D-280-127; Pitch: 2 mm; DatasheetVersion: F-214; PackageVersion: BF, 6/1998; PackageReference: TW-07-03-X-D-280-127; PackageDescription: High Temp 2mm Terminal Strip(Board Stacking); Orientation: Vertical; RoHS: True; Temperature Range: -55 to 125 degC; Mounting Technology: Through-hole; ComponentLink1Description: Manufacturer URL; ComponentLink1URL: http://www.samtec.com; ComponentLink2Description: Datasheet; ComponentLink2URL: http://d2a072wq521u33.cloudfront.net/catalog_english//TW_TH.PDF; ComponentLink3Description: Package Specification; ComponentLink3URL: http://www.samtec.com/documents/webfiles/cpdf/TW-XX-XX-X-X-XXX-XXX-XXX-XX-MKT2.pdf
footprint SMTC-TW-07-03-X-D-280-127 (Terminal Strip, 2x7 Pins, Vertical, 2mm Pitch, Male)
pins: 1, 2, 3, 4, 5, 6, 7, 8, 9, 10, 11, 12, 13, 14

## TW-07-03-F-D-290-095
designator P?
Through-Hole Board Stacker, Vertical, -55 to 125 degC, 2 mm Pitch, 14-Pin, Male, RoHS; Manufacturer: Samtec; PartNumber: TW-07-03-F-D-290-095; Pitch: 2 mm; DatasheetVersion: F-214; PackageVersion: BF, 6/1998; PackageReference: TW-07-03-X-D-290-095; PackageDescription: High Temp 2mm Terminal Strip(Board Stacking); Orientation: Vertical; RoHS: True; Temperature Range: -55 to 125 degC; Mounting Technology: Through-hole; ComponentLink1Description: Manufacturer URL; ComponentLink1URL: http://www.samtec.com; ComponentLink2Description: Datasheet; ComponentLink2URL: http://d2a072wq521u33.cloudfront.net/catalog_english//TW_TH.PDF; ComponentLink3Description: Package Specification; ComponentLink3URL: http://www.samtec.com/documents/webfiles/cpdf/TW-XX-XX-X-X-XXX-XXX-XXX-XX-MKT2.pdf
footprint SMTC-TW-07-03-X-D-290-095 (Terminal Strip, 2x7 Pins, Vertical, 2mm Pitch, Male)
pins: 1, 2, 3, 4, 5, 6, 7, 8, 9, 10, 11, 12, 13, 14

## TW-07-03-L-D-214-160
designator P?
Through-Hole Board Stacker, Vertical, -55 to 125 degC, 2 mm Pitch, 14-Pin, Male, RoHS; Manufacturer: Samtec; PartNumber: TW-07-03-L-D-214-160; Pitch: 2 mm; DatasheetVersion: F-214; PackageVersion: BF, 6/1998; PackageReference: TW-07-03-X-D-214-160; PackageDescription: High Temp 2mm Terminal Strip(Board Stacking); Orientation: Vertical; RoHS: True; Temperature Range: -55 to 125 degC; Mounting Technology: Through-hole; ComponentLink1Description: Manufacturer URL; ComponentLink1URL: http://www.samtec.com; ComponentLink2Description: Datasheet; ComponentLink2URL: http://d2a072wq521u33.cloudfront.net/catalog_english//TW_TH.PDF; ComponentLink3Description: Package Specification; ComponentLink3URL: http://www.samtec.com/documents/webfiles/cpdf/TW-XX-XX-X-X-XXX-XXX-XXX-XX-MKT2.pdf
footprint SMTC-TW-07-03-X-D-214-160 (Terminal Strip, 2x7 Pins, Vertical, 2mm Pitch, Male)
pins: 1, 2, 3, 4, 5, 6, 7, 8, 9, 10, 11, 12, 13, 14

## TW-07-03-L-D-220-120
designator P?
Through-Hole Board Stacker, Vertical, -55 to 125 degC, 2 mm Pitch, 14-Pin, Male, RoHS; Manufacturer: Samtec; PartNumber: TW-07-03-L-D-220-120; Pitch: 2 mm; DatasheetVersion: F-214; PackageVersion: BF, 6/1998; PackageReference: TW-07-03-X-D-220-120; PackageDescription: High Temp 2mm Terminal Strip(Board Stacking); Orientation: Vertical; RoHS: True; Temperature Range: -55 to 125 degC; Mounting Technology: Through-hole; ComponentLink1Description: Manufacturer URL; ComponentLink1URL: http://www.samtec.com; ComponentLink2Description: Datasheet; ComponentLink2URL: http://d2a072wq521u33.cloudfront.net/catalog_english//TW_TH.PDF; ComponentLink3Description: Package Specification; ComponentLink3URL: http://www.samtec.com/documents/webfiles/cpdf/TW-XX-XX-X-X-XXX-XXX-XXX-XX-MKT2.pdf
footprint SMTC-TW-07-03-X-D-220-120 (Terminal Strip, 2x7 Pins, Vertical, 2mm Pitch, Male)
pins: 1, 2, 3, 4, 5, 6, 7, 8, 9, 10, 11, 12, 13, 14

## TW-07-03-L-D-280-127
designator P?
Through-Hole Board Stacker, Vertical, -55 to 125 degC, 2 mm Pitch, 14-Pin, Male, RoHS; Manufacturer: Samtec; PartNumber: TW-07-03-L-D-280-127; Pitch: 2 mm; DatasheetVersion: F-214; PackageVersion: BF, 6/1998; PackageReference: TW-07-03-X-D-280-127; PackageDescription: High Temp 2mm Terminal Strip(Board Stacking); Orientation: Vertical; RoHS: True; Temperature Range: -55 to 125 degC; Mounting Technology: Through-hole; ComponentLink1Description: Manufacturer URL; ComponentLink1URL: http://www.samtec.com; ComponentLink2Description: Datasheet; ComponentLink2URL: http://d2a072wq521u33.cloudfront.net/catalog_english//TW_TH.PDF; ComponentLink3Description: Package Specification; ComponentLink3URL: http://www.samtec.com/documents/webfiles/cpdf/TW-XX-XX-X-X-XXX-XXX-XXX-XX-MKT2.pdf
footprint SMTC-TW-07-03-X-D-280-127 (Terminal Strip, 2x7 Pins, Vertical, 2mm Pitch, Male)
pins: 1, 2, 3, 4, 5, 6, 7, 8, 9, 10, 11, 12, 13, 14

## TW-07-03-L-D-290-095
designator P?
Through-Hole Board Stacker, Vertical, -55 to 125 degC, 2 mm Pitch, 14-Pin, Male, RoHS; Manufacturer: Samtec; PartNumber: TW-07-03-L-D-290-095; Pitch: 2 mm; DatasheetVersion: F-214; PackageVersion: BF, 6/1998; PackageReference: TW-07-03-X-D-290-095; PackageDescription: High Temp 2mm Terminal Strip(Board Stacking); Orientation: Vertical; RoHS: True; Temperature Range: -55 to 125 degC; Mounting Technology: Through-hole; ComponentLink1Description: Manufacturer URL; ComponentLink1URL: http://www.samtec.com; ComponentLink2Description: Datasheet; ComponentLink2URL: http://d2a072wq521u33.cloudfront.net/catalog_english//TW_TH.PDF; ComponentLink3Description: Package Specification; ComponentLink3URL: http://www.samtec.com/documents/webfiles/cpdf/TW-XX-XX-X-X-XXX-XXX-XXX-XX-MKT2.pdf
footprint SMTC-TW-07-03-X-D-290-095 (Terminal Strip, 2x7 Pins, Vertical, 2mm Pitch, Male)
pins: 1, 2, 3, 4, 5, 6, 7, 8, 9, 10, 11, 12, 13, 14

## TW-07-03-T-D-214-160
designator P?
Through-Hole Board Stacker, Vertical, -55 to 105 degC, 2 mm Pitch, 14-Pin, Male, RoHS; Manufacturer: Samtec; PartNumber: TW-07-03-T-D-214-160; Pitch: 2 mm; DatasheetVersion: F-214; PackageVersion: BF, 6/1998; PackageReference: TW-07-03-X-D-214-160; PackageDescription: High Temp 2mm Terminal Strip(Board Stacking); Orientation: Vertical; RoHS: True; Temperature Range: -55 to 105 degC; Mounting Technology: Through-hole; ComponentLink1Description: Manufacturer URL; ComponentLink1URL: http://www.samtec.com; ComponentLink2Description: Datasheet; ComponentLink2URL: http://d2a072wq521u33.cloudfront.net/catalog_english//TW_TH.PDF; ComponentLink3Description: Package Specification; ComponentLink3URL: http://www.samtec.com/documents/webfiles/cpdf/TW-XX-XX-X-X-XXX-XXX-XXX-XX-MKT2.pdf
footprint SMTC-TW-07-03-X-D-214-160 (Terminal Strip, 2x7 Pins, Vertical, 2mm Pitch, Male)
pins: 1, 2, 3, 4, 5, 6, 7, 8, 9, 10, 11, 12, 13, 14

## TW-07-03-T-D-220-120
designator P?
Through-Hole Board Stacker, Vertical, -55 to 105 degC, 2 mm Pitch, 14-Pin, Male, RoHS; Manufacturer: Samtec; PartNumber: TW-07-03-T-D-220-120; Pitch: 2 mm; DatasheetVersion: F-214; PackageVersion: BF, 6/1998; PackageReference: TW-07-03-X-D-220-120; PackageDescription: High Temp 2mm Terminal Strip(Board Stacking); Orientation: Vertical; RoHS: True; Temperature Range: -55 to 105 degC; Mounting Technology: Through-hole; ComponentLink1Description: Manufacturer URL; ComponentLink1URL: http://www.samtec.com; ComponentLink2Description: Datasheet; ComponentLink2URL: http://d2a072wq521u33.cloudfront.net/catalog_english//TW_TH.PDF; ComponentLink3Description: Package Specification; ComponentLink3URL: http://www.samtec.com/documents/webfiles/cpdf/TW-XX-XX-X-X-XXX-XXX-XXX-XX-MKT2.pdf
footprint SMTC-TW-07-03-X-D-220-120 (Terminal Strip, 2x7 Pins, Vertical, 2mm Pitch, Male)
pins: 1, 2, 3, 4, 5, 6, 7, 8, 9, 10, 11, 12, 13, 14

## TW-07-03-T-D-280-127
designator P?
Through-Hole Board Stacker, Vertical, -55 to 105 degC, 2 mm Pitch, 14-Pin, Male, RoHS; Manufacturer: Samtec; PartNumber: TW-07-03-T-D-280-127; Pitch: 2 mm; DatasheetVersion: F-214; PackageVersion: BF, 6/1998; PackageReference: TW-07-03-X-D-280-127; PackageDescription: High Temp 2mm Terminal Strip(Board Stacking); Orientation: Vertical; RoHS: True; Temperature Range: -55 to 105 degC; Mounting Technology: Through-hole; ComponentLink1Description: Manufacturer URL; ComponentLink1URL: http://www.samtec.com; ComponentLink2Description: Datasheet; ComponentLink2URL: http://d2a072wq521u33.cloudfront.net/catalog_english//TW_TH.PDF; ComponentLink3Description: Package Specification; ComponentLink3URL: http://www.samtec.com/documents/webfiles/cpdf/TW-XX-XX-X-X-XXX-XXX-XXX-XX-MKT2.pdf
footprint SMTC-TW-07-03-X-D-280-127 (Terminal Strip, 2x7 Pins, Vertical, 2mm Pitch, Male)
pins: 1, 2, 3, 4, 5, 6, 7, 8, 9, 10, 11, 12, 13, 14

## TW-07-03-T-D-290-095
designator P?
Through-Hole Board Stacker, Vertical, -55 to 105 degC, 2 mm Pitch, 14-Pin, Male, RoHS; Manufacturer: Samtec; PartNumber: TW-07-03-T-D-290-095; Pitch: 2 mm; DatasheetVersion: F-214; PackageVersion: BF, 6/1998; PackageReference: TW-07-03-X-D-290-095; PackageDescription: High Temp 2mm Terminal Strip(Board Stacking); Orientation: Vertical; RoHS: True; Temperature Range: -55 to 105 degC; Mounting Technology: Through-hole; ComponentLink1Description: Manufacturer URL; ComponentLink1URL: http://www.samtec.com; ComponentLink2Description: Datasheet; ComponentLink2URL: http://d2a072wq521u33.cloudfront.net/catalog_english//TW_TH.PDF; ComponentLink3Description: Package Specification; ComponentLink3URL: http://www.samtec.com/documents/webfiles/cpdf/TW-XX-XX-X-X-XXX-XXX-XXX-XX-MKT2.pdf
footprint SMTC-TW-07-03-X-D-290-095 (Terminal Strip, 2x7 Pins, Vertical, 2mm Pitch, Male)
pins: 1, 2, 3, 4, 5, 6, 7, 8, 9, 10, 11, 12, 13, 14
